# Altium schematic symbol library jlcpcb_2025_04_inductors_extended_0805.schlib: 882 symbols (part 1 of 5) (continued)
## CL201209T-R22K-N (continued)

## CL201209T-R39K-N
designator L?  Inductance: 390nH
Inductor, 390nH, ±10%, 650mΩ, 250mA, SMD 0805; Manufacturer: Chilisin Elec; Manufacturer Part Number: CL201209T-R39K-N; Self-Resonant Frequency: 135MHz; Q Factor: 25@25MHz; Package Size: 0805; JLCPCB Basic Part: No; JLCPCB Part Number: C280243; Supplier 1: LCSC; Category: Inductors; Supplier Part Number 1: C280243; Tolerance: ±10%; Rated Current: 250mA; DC Resistance: 650mΩ; RoHS: Yes; ComponentLink1Description: Datasheet; ComponentLink1URL: https://wmsc.lcsc.com/wmsc/upload/file/pdf/v2/lcsc/2304140030_Chilisin-Elec-CL201209T-R39K-N_C280243.pdf; ComponentLink2Description: JLCPCB Part URL; ComponentLink2URL: https://jlcpcb.com/partdetail/C280243; ComponentLink3Description: LCSC Part URL; ComponentLink3URL: https://lcsc.com/product-detail/Inductors-SMD_Chilisin-Elec-Chilisin-Elec-CL201209T-R39K-N_C280243.html
footprint IND-0805 (0805 (2012M) Inductor)
pins: 1, 2

## CL201209T-R47K-N
designator L?  Inductance: 470nH
Inductor, 470nH, ±10%, 650mΩ, 250mA, SMD 0805; Manufacturer: Chilisin Elec; Manufacturer Part Number: CL201209T-R47K-N; Self-Resonant Frequency: 125MHz; Q Factor: 25@25MHz; Package Size: 0805; JLCPCB Basic Part: No; JLCPCB Part Number: C142264; Supplier 1: LCSC; Category: Inductors; Supplier Part Number 1: C142264; Tolerance: ±10%; Rated Current: 250mA; DC Resistance: 650mΩ; RoHS: Yes; ComponentLink1Description: Datasheet; ComponentLink1URL: https://wmsc.lcsc.com/wmsc/upload/file/pdf/v2/lcsc/2304140030_Chilisin-Elec-CL201209T-R47K-N_C142264.pdf; ComponentLink2Description: JLCPCB Part URL; ComponentLink2URL: https://jlcpcb.com/partdetail/C142264; ComponentLink3Description: LCSC Part URL; ComponentLink3URL: https://lcsc.com/product-detail/Inductors-SMD_Chilisin-Elec-Chilisin-Elec-CL201209T-R47K-N_C142264.html
footprint IND-0805 (0805 (2012M) Inductor)
pins: 1, 2

## CL201209T-R56K-N
designator L?  Inductance: 560nH
Inductor, 560nH, ±10%, 750mΩ, 150mA, SMD 0805; Manufacturer: Chilisin Elec; Manufacturer Part Number: CL201209T-R56K-N; Self-Resonant Frequency: 115MHz; Q Factor: 25@25MHz; Package Size: 0805; JLCPCB Basic Part: No; JLCPCB Part Number: C280244; Supplier 1: LCSC; Category: Inductors; Supplier Part Number 1: C280244; Tolerance: ±10%; Rated Current: 150mA; DC Resistance: 750mΩ; RoHS: Yes; ComponentLink1Description: Datasheet; ComponentLink1URL: https://wmsc.lcsc.com/wmsc/upload/file/pdf/v2/lcsc/2304140030_Chilisin-Elec-CL201209T-R56K-N_C280244.pdf; ComponentLink2Description: JLCPCB Part URL; ComponentLink2URL: https://jlcpcb.com/partdetail/C280244; ComponentLink3Description: LCSC Part URL; ComponentLink3URL: https://lcsc.com/product-detail/Inductors-SMD_Chilisin-Elec-Chilisin-Elec-CL201209T-R56K-N_C280244.html
footprint IND-0805 (0805 (2012M) Inductor)
pins: 1, 2

## CL201212T-3R3K-N
designator L?  Inductance: 3.3uH
Inductor, 3.3uH, ±10%, 800mΩ, 30mA, SMD 0805; Manufacturer: Chilisin Elec; Manufacturer Part Number: CL201212T-3R3K-N; Self-Resonant Frequency: 41MHz; Q Factor: 45@10MHz; Package Size: 0805; JLCPCB Basic Part: No; JLCPCB Part Number: C373736; Supplier 1: LCSC; Category: Inductors; Supplier Part Number 1: C373736; Tolerance: ±10%; Rated Current: 30mA; DC Resistance: 800mΩ; RoHS: Yes; ComponentLink1Description: Datasheet; ComponentLink1URL: https://wmsc.lcsc.com/wmsc/upload/file/pdf/v2/lcsc/1912111437_Chilisin-Elec-CL201212T-3R3K-N_C373736.pdf; ComponentLink2Description: JLCPCB Part URL; ComponentLink2URL: https://jlcpcb.com/partdetail/C373736; ComponentLink3Description: LCSC Part URL; ComponentLink3URL: https://lcsc.com/product-detail/Inductors-SMD_Chilisin-Elec-Chilisin-Elec-CL201212T-3R3K-N_C373736.html
footprint IND-0805 (0805 (2012M) Inductor)
pins: 1, 2

## CL201212T-4R7K-F
designator L?  Inductance: 4.7uH
Inductor, 4.7uH, ±10%, SMD 0805; Manufacturer: Chilisin Elec; Manufacturer Part Number: CL201212T-4R7K-F; Package Size: 0805; JLCPCB Basic Part: No; JLCPCB Part Number: C285980; Supplier 1: LCSC; Category: Inductors; Supplier Part Number 1: C285980; Tolerance: ±10%; RoHS: Yes; ComponentLink1Description: Datasheet; ComponentLink1URL: https://wmsc.lcsc.com/wmsc/upload/file/pdf/v2/lcsc/2304140030_Chilisin-Elec-CL201212T-4R7K-F_C285980.pdf; ComponentLink2Description: JLCPCB Part URL; ComponentLink2URL: https://jlcpcb.com/partdetail/C285980; ComponentLink3Description: LCSC Part URL; ComponentLink3URL: https://lcsc.com/product-detail/Inductors-SMD_Chilisin-Elec-Chilisin-Elec-CL201212T-4R7K-F_C285980.html
footprint IND-0805 (0805 (2012M) Inductor)
pins: 1, 2

## CL201212T-6R8K-N
designator L?  Inductance: 6.8uH
Inductor, 6.8uH, ±10%, 1Ω, 15mA, SMD 0805; Manufacturer: Chilisin Elec; Manufacturer Part Number: CL201212T-6R8K-N; Self-Resonant Frequency: 29MHz; Q Factor: 45@4MHz; Package Size: 0805; JLCPCB Basic Part: No; JLCPCB Part Number: C365941; Supplier 1: LCSC; Category: Inductors; Supplier Part Number 1: C365941; Tolerance: ±10%; Rated Current: 15mA; DC Resistance: 1Ω; RoHS: Yes; ComponentLink1Description: Datasheet; ComponentLink1URL: https://wmsc.lcsc.com/wmsc/upload/file/pdf/v2/lcsc/2304140030_Chilisin-Elec-CL201212T-6R8K-N_C365941.pdf; ComponentLink2Description: JLCPCB Part URL; ComponentLink2URL: https://jlcpcb.com/partdetail/C365941; ComponentLink3Description: LCSC Part URL; ComponentLink3URL: https://lcsc.com/product-detail/Inductors-SMD_Chilisin-Elec-Chilisin-Elec-CL201212T-6R8K-N_C365941.html
footprint IND-0805 (0805 (2012M) Inductor)
pins: 1, 2

## CL201212T-8R2K-N
designator L?  Inductance: 8.2uH
Inductor, 8.2uH, ±10%, 1.1Ω, 15mA, SMD 0805; Manufacturer: Chilisin Elec; Manufacturer Part Number: CL201212T-8R2K-N; Self-Resonant Frequency: 26MHz; Q Factor: 45@4MHz; Package Size: 0805; JLCPCB Basic Part: No; JLCPCB Part Number: C365944; Supplier 1: LCSC; Category: Inductors; Supplier Part Number 1: C365944; Tolerance: ±10%; Rated Current: 15mA; DC Resistance: 1.1Ω; RoHS: Yes; ComponentLink1Description: Datasheet; ComponentLink1URL: https://wmsc.lcsc.com/wmsc/upload/file/pdf/v2/lcsc/2304140030_Chilisin-Elec-CL201212T-8R2K-N_C365944.pdf; ComponentLink2Description: JLCPCB Part URL; ComponentLink2URL: https://jlcpcb.com/partdetail/C365944; ComponentLink3Description: LCSC Part URL; ComponentLink3URL: https://lcsc.com/product-detail/Inductors-SMD_Chilisin-Elec-Chilisin-Elec-CL201212T-8R2K-N_C365944.html
footprint IND-0805 (0805 (2012M) Inductor)
pins: 1, 2

## CL201212T-100K-N
designator L?  Inductance: 10uH
Inductor, 10uH, ±10%, 1.1Ω, 15mA, SMD 0805; Manufacturer: Chilisin Elec; Manufacturer Part Number: CL201212T-100K-N; Self-Resonant Frequency: 24MHz; Q Factor: 45@2MHz; Package Size: 0805; JLCPCB Basic Part: No; JLCPCB Part Number: C142263; Supplier 1: LCSC; Category: Inductors; Supplier Part Number 1: C142263; Tolerance: ±10%; Rated Current: 15mA; DC Resistance: 1.1Ω; RoHS: Yes; ComponentLink1Description: Datasheet; ComponentLink1URL: https://wmsc.lcsc.com/wmsc/upload/file/pdf/v2/lcsc/2304140030_Chilisin-Elec-CL201212T-100K-N_C142263.pdf; ComponentLink2Description: JLCPCB Part URL; ComponentLink2URL: https://jlcpcb.com/partdetail/C142263; ComponentLink3Description: LCSC Part URL; ComponentLink3URL: https://lcsc.com/product-detail/Inductors-SMD_Chilisin-Elec-Chilisin-Elec-CL201212T-100K-N_C142263.html
footprint IND-0805 (0805 (2012M) Inductor)
pins: 1, 2

## CL201212T-100M-N
designator L?  Inductance: 10uH
Inductor, 10uH, ±20%, 1.1Ω, 15mA, SMD 0805; Manufacturer: Chilisin Elec; Manufacturer Part Number: CL201212T-100M-N; Self-Resonant Frequency: 24MHz; Q Factor: 45@2MHz; Package Size: 0805; JLCPCB Basic Part: No; JLCPCB Part Number: C285981; Supplier 1: LCSC; Category: Inductors; Supplier Part Number 1: C285981; Tolerance: ±20%; Rated Current: 15mA; DC Resistance: 1.1Ω; RoHS: Yes; ComponentLink1Description: Datasheet; ComponentLink1URL: https://wmsc.lcsc.com/wmsc/upload/file/pdf/v2/lcsc/2304140030_Chilisin-Elec-CL201212T-100M-N_C285981.pdf; ComponentLink2Description: JLCPCB Part URL; ComponentLink2URL: https://jlcpcb.com/partdetail/C285981; ComponentLink3Description: LCSC Part URL; ComponentLink3URL: https://lcsc.com/product-detail/Inductors-SMD_Chilisin-Elec-Chilisin-Elec-CL201212T-100M-N_C285981.html
footprint IND-0805 (0805 (2012M) Inductor)
pins: 1, 2

## CL201212T-220K-N
designator L?  Inductance: 22uH
Inductor, 22uH, ±10%, 1.1Ω, 5mA, SMD 0805; Manufacturer: Chilisin Elec; Manufacturer Part Number: CL201212T-220K-N; Self-Resonant Frequency: 16MHz; Q Factor: 30@1MHz; Package Size: 0805; JLCPCB Basic Part: No; JLCPCB Part Number: C365913; Supplier 1: LCSC; Category: Inductors; Supplier Part Number 1: C365913; Tolerance: ±10%; Rated Current: 5mA; DC Resistance: 1.1Ω; RoHS: Yes; ComponentLink1Description: Datasheet; ComponentLink1URL: https://wmsc.lcsc.com/wmsc/upload/file/pdf/v2/lcsc/1912111437_Chilisin-Elec-CL201212T-220K-N_C365913.pdf; ComponentLink2Description: JLCPCB Part URL; ComponentLink2URL: https://jlcpcb.com/partdetail/C365913; ComponentLink3Description: LCSC Part URL; ComponentLink3URL: https://lcsc.com/product-detail/Inductors-SMD_Chilisin-Elec-Chilisin-Elec-CL201212T-220K-N_C365913.html
footprint IND-0805 (0805 (2012M) Inductor)
pins: 1, 2

## CLH2012T-6N8J-S
designator L?  Inductance: 6.8nH
Inductor, 6.8nH, ±5%, 250mΩ, 300mA, SMD 0805; Manufacturer: Chilisin Elec; Manufacturer Part Number: CLH2012T-6N8J-S; Self-Resonant Frequency: 3.65GHz; Q Factor: 15@100MHz; Package Size: 0805; JLCPCB Basic Part: No; JLCPCB Part Number: C329644; Supplier 1: LCSC; Category: Inductors; Supplier Part Number 1: C329644; Tolerance: ±5%; Rated Current: 300mA; DC Resistance: 250mΩ; RoHS: Yes; ComponentLink1Description: Datasheet; ComponentLink1URL: https://wmsc.lcsc.com/wmsc/upload/file/pdf/v2/lcsc/1912111437_Chilisin-Elec-CLH2012T-6N8J-S_C329644.pdf; ComponentLink2Description: JLCPCB Part URL; ComponentLink2URL: https://jlcpcb.com/partdetail/C329644; ComponentLink3Description: LCSC Part URL; ComponentLink3URL: https://lcsc.com/product-detail/Inductors-SMD_Chilisin-Elec-Chilisin-Elec-CLH2012T-6N8J-S_C329644.html
footprint IND-0805 (0805 (2012M) Inductor)
pins: 1, 2

## CLH2012T-10NJ-S
designator L?  Inductance: 10nH
Inductor, 10nH, ±5%, 300mΩ, 300mA, SMD 0805; Manufacturer: Chilisin Elec; Manufacturer Part Number: CLH2012T-10NJ-S; Self-Resonant Frequency: 2.5GHz; Q Factor: 18@100MHz; Package Size: 0805; JLCPCB Basic Part: No; JLCPCB Part Number: C180932; Supplier 1: LCSC; Category: Inductors; Supplier Part Number 1: C180932; Tolerance: ±5%; Rated Current: 300mA; DC Resistance: 300mΩ; RoHS: Yes; ComponentLink1Description: Datasheet; ComponentLink1URL: https://wmsc.lcsc.com/wmsc/upload/file/pdf/v2/lcsc/1810261211_Chilisin-Elec-CLH2012T-10NJ-S_C180932.pdf; ComponentLink2Description: JLCPCB Part URL; ComponentLink2URL: https://jlcpcb.com/partdetail/C180932; ComponentLink3Description: LCSC Part URL; ComponentLink3URL: https://lcsc.com/product-detail/Inductors-SMD_Chilisin-Elec-Chilisin-Elec-CLH2012T-10NJ-S_C180932.html
footprint IND-0805 (0805 (2012M) Inductor)
pins: 1, 2

## CLH2012T-22NJ-S
designator L?  Inductance: 22nH
Inductor, 22nH, ±5%, 500mΩ, 300mA, SMD 0805; Manufacturer: Chilisin Elec; Manufacturer Part Number: CLH2012T-22NJ-S; Self-Resonant Frequency: 1.7GHz; Q Factor: 18@100MHz; Package Size: 0805; JLCPCB Basic Part: No; JLCPCB Part Number: C180930; Supplier 1: LCSC; Category: Inductors; Supplier Part Number 1: C180930; Tolerance: ±5%; Rated Current: 300mA; DC Resistance: 500mΩ; RoHS: Yes; ComponentLink1Description: Datasheet; ComponentLink1URL: https://wmsc.lcsc.com/wmsc/upload/file/pdf/v2/lcsc/1810261211_Chilisin-Elec-CLH2012T-22NJ-S_C180930.pdf; ComponentLink2Description: JLCPCB Part URL; ComponentLink2URL: https://jlcpcb.com/partdetail/C180930; ComponentLink3Description: LCSC Part URL; ComponentLink3URL: https://lcsc.com/product-detail/Inductors-SMD_Chilisin-Elec-Chilisin-Elec-CLH2012T-22NJ-S_C180930.html
footprint IND-0805 (0805 (2012M) Inductor)
pins: 1, 2

## CMCC2012C4N7SSP
designator L?  Inductance: 4.7nH
Inductor, 4.7nH, 0.2Ω, 500mA, SMD 0805; Manufacturer: Cybermax; Manufacturer Part Number: CMCC2012C4N7SSP; Self-Resonant Frequency: 4GHz; Q Factor: 12@100MHz; Package Size: 0805; JLCPCB Basic Part: No; JLCPCB Part Number: C919374; Supplier 1: LCSC; Category: Inductors; Supplier Part Number 1: C919374; Rated Current: 500mA; DC Resistance: 0.2Ω; RoHS: Yes; ComponentLink1Description: Datasheet; ComponentLink1URL: https://wmsc.lcsc.com/wmsc/upload/file/pdf/v2/lcsc/2404011708_Cybermax-CMCC2012C4N7SSP_C919374.pdf; ComponentLink2Description: JLCPCB Part URL; ComponentLink2URL: https://jlcpcb.com/partdetail/C919374; ComponentLink3Description: LCSC Part URL; ComponentLink3URL: https://lcsc.com/product-detail/Inductors-SMD_Cybermax-Cybermax-CMCC2012C4N7SSP_C919374.html
footprint IND-0805 (0805 (2012M) Inductor)
pins: 1, 2

## CMCC2012C15NJSP
designator L?  Inductance: 15nH
Inductor, 15nH, ±5%, 0.4Ω, 500mA, SMD 0805; Manufacturer: Cybermax; Manufacturer Part Number: CMCC2012C15NJSP; Self-Resonant Frequency: 1800MHz; Q Factor: 15@100MHz; Package Size: 0805; JLCPCB Basic Part: No; JLCPCB Part Number: C919377; Supplier 1: LCSC; Category: Inductors; Supplier Part Number 1: C919377; Tolerance: ±5%; Rated Current: 500mA; DC Resistance: 0.4Ω; RoHS: Yes; ComponentLink1Description: Datasheet; ComponentLink1URL: https://wmsc.lcsc.com/wmsc/upload/file/pdf/v2/lcsc/2404011708_Cybermax-CMCC2012C15NJSP_C919377.pdf; ComponentLink2Description: JLCPCB Part URL; ComponentLink2URL: https://jlcpcb.com/partdetail/C919377; ComponentLink3Description: LCSC Part URL; ComponentLink3URL: https://lcsc.com/product-detail/Inductors-SMD_Cybermax-Cybermax-CMCC2012C15NJSP_C919377.html
footprint IND-0805 (0805 (2012M) Inductor)
pins: 1, 2

## CMCC2012C47NJSP
designator L?  Inductance: 47nH
Inductor, 47nH, ±5%, 0.7Ω, 300mA, SMD 0805; Manufacturer: Cybermax; Manufacturer Part Number: CMCC2012C47NJSP; Self-Resonant Frequency: 1GHz; Q Factor: 18@100MHz; Package Size: 0805; JLCPCB Basic Part: No; JLCPCB Part Number: C919382; Supplier 1: LCSC; Category: Inductors; Supplier Part Number 1: C919382; Tolerance: ±5%; Rated Current: 300mA; DC Resistance: 0.7Ω; RoHS: Yes; ComponentLink1Description: Datasheet; ComponentLink1URL: https://wmsc.lcsc.com/wmsc/upload/file/pdf/v2/lcsc/2404011708_Cybermax-CMCC2012C47NJSP_C919382.pdf; ComponentLink2Description: JLCPCB Part URL; ComponentLink2URL: https://jlcpcb.com/partdetail/C919382; ComponentLink3Description: LCSC Part URL; ComponentLink3URL: https://lcsc.com/product-detail/Inductors-SMD_Cybermax-Cybermax-CMCC2012C47NJSP_C919382.html
footprint IND-0805 (0805 (2012M) Inductor)
pins: 1, 2

## CMCC2012CR12JSP
designator L?  Inductance: 0.12uH
Inductor, 0.12uH, ±5%, 0.95Ω, 300mA, SMD 0805; Manufacturer: Cybermax; Manufacturer Part Number: CMCC2012CR12JSP; Self-Resonant Frequency: 600MHz; Q Factor: 13@50MHz; Package Size: 0805; JLCPCB Basic Part: No; JLCPCB Part Number: C919386; Supplier 1: LCSC; Category: Inductors; Supplier Part Number 1: C919386; Tolerance: ±5%; Rated Current: 300mA; DC Resistance: 0.95Ω; RoHS: Yes; ComponentLink1Description: Datasheet; ComponentLink1URL: https://wmsc.lcsc.com/wmsc/upload/file/pdf/v2/lcsc/2404011708_Cybermax-CMCC2012CR12JSP_C919386.pdf; ComponentLink2Description: JLCPCB Part URL; ComponentLink2URL: https://jlcpcb.com/partdetail/C919386; ComponentLink3Description: LCSC Part URL; ComponentLink3URL: https://lcsc.com/product-detail/Inductors-SMD_Cybermax-Cybermax-CMCC2012CR12JSP_C919386.html
footprint IND-0805 (0805 (2012M) Inductor)
pins: 1, 2

## CMCC2012CR33JSP
designator L?  Inductance: 0.33uH
Inductor, 0.33uH, ±5%, 2Ω, 300mA, SMD 0805; Manufacturer: Cybermax; Manufacturer Part Number: CMCC2012CR33JSP; Self-Resonant Frequency: 300MHz; Q Factor: 12@50MHz; Package Size: 0805; JLCPCB Basic Part: No; JLCPCB Part Number: C919391; Supplier 1: LCSC; Category: Inductors; Supplier Part Number 1: C919391; Tolerance: ±5%; Rated Current: 300mA; DC Resistance: 2Ω; RoHS: Yes; ComponentLink1Description: Datasheet; ComponentLink1URL: https://wmsc.lcsc.com/wmsc/upload/file/pdf/v2/lcsc/2404011708_Cybermax-CMCC2012CR33JSP_C919391.pdf; ComponentLink2Description: JLCPCB Part URL; ComponentLink2URL: https://jlcpcb.com/partdetail/C919391; ComponentLink3Description: LCSC Part URL; ComponentLink3URL: https://lcsc.com/product-detail/Inductors-SMD_Cybermax-Cybermax-CMCC2012CR33JSP_C919391.html
footprint IND-0805 (0805 (2012M) Inductor)
pins: 1, 2

## CMI201209J150KT
designator L?  Inductance: 15uH
Inductor, 15uH, ±10%, 1.15Ω, 5mA, SMD 0805; Manufacturer: FH(Guangdong Fenghua Advanced Tech); Manufacturer Part Number: CMI201209J150KT; Self-Resonant Frequency: 19MHz; Q Factor: 25@1MHz; Package Size: 0805; JLCPCB Basic Part: No; JLCPCB Part Number: C75634; Supplier 1: LCSC; Category: Inductors; Supplier Part Number 1: C75634; Tolerance: ±10%; Rated Current: 5mA; DC Resistance: 1.15Ω; RoHS: Yes; ComponentLink1Description: Datasheet; ComponentLink1URL: https://wmsc.lcsc.com/wmsc/upload/file/pdf/v2/lcsc/2302231101_FH--Guangdong-Fenghua-Advanced-Tech-CMI201209J150KT_C75634.pdf; ComponentLink2Description: JLCPCB Part URL; ComponentLink2URL: https://jlcpcb.com/partdetail/C75634; ComponentLink3Description: LCSC Part URL; ComponentLink3URL: https://lcsc.com/product-detail/Inductors-SMD_FH-Guangdong-Fenghua-Advanced-Tech-FH-Guangdong-Fenghua-Advanced-Tech-CMI201209J150KT_C75634.html
footprint IND-0805 (0805 (2012M) Inductor)
pins: 1, 2

## CMI201209J180KT
designator L?  Inductance: 18uH
Inductor, 18uH, ±10%, 1.2Ω, 5mA, SMD 0805; Manufacturer: FH(Guangdong Fenghua Advanced Tech); Manufacturer Part Number: CMI201209J180KT; Self-Resonant Frequency: 18MHz; Q Factor: 25@1MHz; Package Size: 0805; JLCPCB Basic Part: No; JLCPCB Part Number: C394970; Supplier 1: LCSC; Category: Inductors; Supplier Part Number 1: C394970; Tolerance: ±10%; Rated Current: 5mA; DC Resistance: 1.2Ω; RoHS: Yes; ComponentLink1Description: Datasheet; ComponentLink1URL: https://wmsc.lcsc.com/wmsc/upload/file/pdf/v2/lcsc/2302231208_FH--Guangdong-Fenghua-Advanced-Tech-CMI201209J180KT_C394970.pdf; ComponentLink2Description: JLCPCB Part URL; ComponentLink2URL: https://jlcpcb.com/partdetail/C394970; ComponentLink3Description: LCSC Part URL; ComponentLink3URL: https://lcsc.com/product-detail/Inductors-SMD_FH-Guangdong-Fenghua-Advanced-Tech-FH-Guangdong-Fenghua-Advanced-Tech-CMI201209J180KT_C394970.html
footprint IND-0805 (0805 (2012M) Inductor)
pins: 1, 2

## CMI201209J220KT
designator L?  Inductance: 22uH
Inductor, 22uH, ±10%, 1.2Ω, 5mA, SMD 0805; Manufacturer: FH(Guangdong Fenghua Advanced Tech); Manufacturer Part Number: CMI201209J220KT; Self-Resonant Frequency: 16MHz; Q Factor: 25@1MHz; Package Size: 0805; JLCPCB Basic Part: No; JLCPCB Part Number: C105501; Supplier 1: LCSC; Category: Inductors; Supplier Part Number 1: C105501; Tolerance: ±10%; Rated Current: 5mA; DC Resistance: 1.2Ω; RoHS: Yes; ComponentLink1Description: Datasheet; ComponentLink1URL: https://wmsc.lcsc.com/wmsc/upload/file/pdf/v2/lcsc/2302231030_FH--Guangdong-Fenghua-Advanced-Tech-CMI201209J220KT_C105501.pdf; ComponentLink2Description: JLCPCB Part URL; ComponentLink2URL: https://jlcpcb.com/partdetail/C105501; ComponentLink3Description: LCSC Part URL; ComponentLink3URL: https://lcsc.com/product-detail/Inductors-SMD_FH-Guangdong-Fenghua-Advanced-Tech-FH-Guangdong-Fenghua-Advanced-Tech-CMI201209J220KT_C105501.html
footprint IND-0805 (0805 (2012M) Inductor)
pins: 1, 2

## CMI201209J270KT
designator L?  Inductance: 27uH
Inductor, 27uH, ±10%, 1.5Ω, 5mA, SMD 0805; Manufacturer: FH(Guangdong Fenghua Advanced Tech); Manufacturer Part Number: CMI201209J270KT; Self-Resonant Frequency: 16MHz; Q Factor: 25@1MHz; Package Size: 0805; JLCPCB Basic Part: No; JLCPCB Part Number: C394971; Supplier 1: LCSC; Category: Inductors; Supplier Part Number 1: C394971; Tolerance: ±10%; Rated Current: 5mA; DC Resistance: 1.5Ω; RoHS: Yes; ComponentLink1Description: Datasheet; ComponentLink1URL: https://wmsc.lcsc.com/wmsc/upload/file/pdf/v2/lcsc/2302231208_FH--Guangdong-Fenghua-Advanced-Tech-CMI201209J270KT_C394971.pdf; ComponentLink2Description: JLCPCB Part URL; ComponentLink2URL: https://jlcpcb.com/partdetail/C394971; ComponentLink3Description: LCSC Part URL; ComponentLink3URL: https://lcsc.com/product-detail/Inductors-SMD_FH-Guangdong-Fenghua-Advanced-Tech-FH-Guangdong-Fenghua-Advanced-Tech-CMI201209J270KT_C394971.html
footprint IND-0805 (0805 (2012M) Inductor)
pins: 1, 2

## CMI201209J330KT
designator L?  Inductance: 33uH
Inductor, 33uH, ±10%, SMD 0805; Manufacturer: FH(Guangdong Fenghua Advanced Tech); Manufacturer Part Number: CMI201209J330KT; Package Size: 0805; JLCPCB Basic Part: No; JLCPCB Part Number: C139218; Supplier 1: LCSC; Category: Inductors; Supplier Part Number 1: C139218; Tolerance: ±10%; RoHS: Yes; ComponentLink1Description: Datasheet; ComponentLink1URL: https://wmsc.lcsc.com/wmsc/upload/file/pdf/v2/lcsc/2307041629_FH--Guangdong-Fenghua-Advanced-Tech-CMI201209J330KT_C139218.pdf; ComponentLink2Description: JLCPCB Part URL; ComponentLink2URL: https://jlcpcb.com/partdetail/C139218; ComponentLink3Description: LCSC Part URL; ComponentLink3URL: https://lcsc.com/product-detail/Inductors-SMD_FH-Guangdong-Fenghua-Advanced-Tech-FH-Guangdong-Fenghua-Advanced-Tech-CMI201209J330KT_C139218.html
footprint IND-0805 (0805 (2012M) Inductor)
pins: 1, 2

## CMI201209U1R0KT
designator L?  Inductance: 1uH
Inductor, 1uH, ±10%, 400mΩ, 50mA, SMD 0805; Manufacturer: FH(Guangdong Fenghua Advanced Tech); Manufacturer Part Number: CMI201209U1R0KT; Self-Resonant Frequency: 75MHz; Q Factor: 35@10MHz; Package Size: 0805; JLCPCB Basic Part: No; JLCPCB Part Number: C99367; Supplier 1: LCSC; Category: Inductors; Supplier Part Number 1: C99367; Tolerance: ±10%; Rated Current: 50mA; DC Resistance: 400mΩ; RoHS: Yes; ComponentLink1Description: Datasheet; ComponentLink1URL: https://wmsc.lcsc.com/wmsc/upload/file/pdf/v2/lcsc/2302231230_FH--Guangdong-Fenghua-Advanced-Tech-CMI201209U1R0KT_C99367.pdf; ComponentLink2Description: JLCPCB Part URL; ComponentLink2URL: https://jlcpcb.com/partdetail/C99367; ComponentLink3Description: LCSC Part URL; ComponentLink3URL: https://lcsc.com/product-detail/Inductors-SMD_FH-Guangdong-Fenghua-Advanced-Tech-FH-Guangdong-Fenghua-Advanced-Tech-CMI201209U1R0KT_C99367.html
footprint IND-0805 (0805 (2012M) Inductor)
pins: 1, 2

## CMI201209U1R2KT
designator L?  Inductance: 1.2uH
Inductor, 1.2uH, ±10%, 400mΩ, 50mA, SMD 0805; Manufacturer: FH(Guangdong Fenghua Advanced Tech); Manufacturer Part Number: CMI201209U1R2KT; Self-Resonant Frequency: 65MHz; Q Factor: 35@10MHz; Package Size: 0805; JLCPCB Basic Part: No; JLCPCB Part Number: C139219; Supplier 1: LCSC; Category: Inductors; Supplier Part Number 1: C139219; Tolerance: ±10%; Rated Current: 50mA; DC Resistance: 400mΩ; RoHS: Yes; ComponentLink1Description: Datasheet; ComponentLink1URL: https://wmsc.lcsc.com/wmsc/upload/file/pdf/v2/lcsc/2302231230_FH--Guangdong-Fenghua-Advanced-Tech-CMI201209U1R2KT_C139219.pdf; ComponentLink2Description: JLCPCB Part URL; ComponentLink2URL: https://jlcpcb.com/partdetail/C139219; ComponentLink3Description: LCSC Part URL; ComponentLink3URL: https://lcsc.com/product-detail/Inductors-SMD_FH-Guangdong-Fenghua-Advanced-Tech-FH-Guangdong-Fenghua-Advanced-Tech-CMI201209U1R2KT_C139219.html
footprint IND-0805 (0805 (2012M) Inductor)
pins: 1, 2

## CMI201209U1R5KT
designator L?  Inductance: 1.5uH
Inductor, 1.5uH, ±10%, 400mΩ, 50mA, SMD 0805; Manufacturer: FH(Guangdong Fenghua Advanced Tech); Manufacturer Part Number: CMI201209U1R5KT; Self-Resonant Frequency: 60MHz; Q Factor: 35@10MHz; Package Size: 0805; JLCPCB Basic Part: No; JLCPCB Part Number: C139220; Supplier 1: LCSC; Category: Inductors; Supplier Part Number 1: C139220; Tolerance: ±10%; Rated Current: 50mA; DC Resistance: 400mΩ; RoHS: Yes; ComponentLink1Description: Datasheet; ComponentLink1URL: https://wmsc.lcsc.com/wmsc/upload/file/pdf/v2/lcsc/2302231230_FH--Guangdong-Fenghua-Advanced-Tech-CMI201209U1R5KT_C139220.pdf; ComponentLink2Description: JLCPCB Part URL; ComponentLink2URL: https://jlcpcb.com/partdetail/C139220; ComponentLink3Description: LCSC Part URL; ComponentLink3URL: https://lcsc.com/product-detail/Inductors-SMD_FH-Guangdong-Fenghua-Advanced-Tech-FH-Guangdong-Fenghua-Advanced-Tech-CMI201209U1R5KT_C139220.html
footprint IND-0805 (0805 (2012M) Inductor)
pins: 1, 2

## CMI201209U1R8KT
designator L?  Inductance: 1.8uH
Inductor, 1.8uH, ±10%, 400mΩ, 50mA, SMD 0805; Manufacturer: FH(Guangdong Fenghua Advanced Tech); Manufacturer Part Number: CMI201209U1R8KT; Self-Resonant Frequency: 55MHz; Q Factor: 35@10MHz; Package Size: 0805; JLCPCB Basic Part: No; JLCPCB Part Number: C139221; Supplier 1: LCSC; Category: Inductors; Supplier Part Number 1: C139221; Tolerance: ±10%; Rated Current: 50mA; DC Resistance: 400mΩ; RoHS: Yes; ComponentLink1Description: Datasheet; ComponentLink1URL: https://wmsc.lcsc.com/wmsc/upload/file/pdf/v2/lcsc/2302231230_FH--Guangdong-Fenghua-Advanced-Tech-CMI201209U1R8KT_C139221.pdf; ComponentLink2Description: JLCPCB Part URL; ComponentLink2URL: https://jlcpcb.com/partdetail/C139221; ComponentLink3Description: LCSC Part URL; ComponentLink3URL: https://lcsc.com/product-detail/Inductors-SMD_FH-Guangdong-Fenghua-Advanced-Tech-FH-Guangdong-Fenghua-Advanced-Tech-CMI201209U1R8KT_C139221.html
footprint IND-0805 (0805 (2012M) Inductor)
pins: 1, 2

## CMI201209U2R2KT
designator L?  Inductance: 2.2uH
Inductor, 2.2uH, ±10%, 600mΩ, 50mA, SMD 0805; Manufacturer: FH(Guangdong Fenghua Advanced Tech); Manufacturer Part Number: CMI201209U2R2KT; Self-Resonant Frequency: 50MHz; Q Factor: 35@10MHz; Package Size: 0805; JLCPCB Basic Part: No; JLCPCB Part Number: C1043; Supplier 1: LCSC; Category: Inductors; Supplier Part Number 1: C1043; Tolerance: ±10%; Rated Current: 50mA; DC Resistance: 600mΩ; RoHS: Yes; ComponentLink1Description: Datasheet; ComponentLink1URL: https://wmsc.lcsc.com/wmsc/upload/file/pdf/v2/lcsc/2302231101_FH--Guangdong-Fenghua-Advanced-Tech-CMI201209U2R2KT_C1043.pdf; ComponentLink2Description: JLCPCB Part URL; ComponentLink2URL: https://jlcpcb.com/partdetail/C1043; ComponentLink3Description: LCSC Part URL; ComponentLink3URL: https://lcsc.com/product-detail/Inductors-SMD_FH-Guangdong-Fenghua-Advanced-Tech-FH-Guangdong-Fenghua-Advanced-Tech-CMI201209U2R2KT_C1043.html
footprint IND-0805 (0805 (2012M) Inductor)
pins: 1, 2

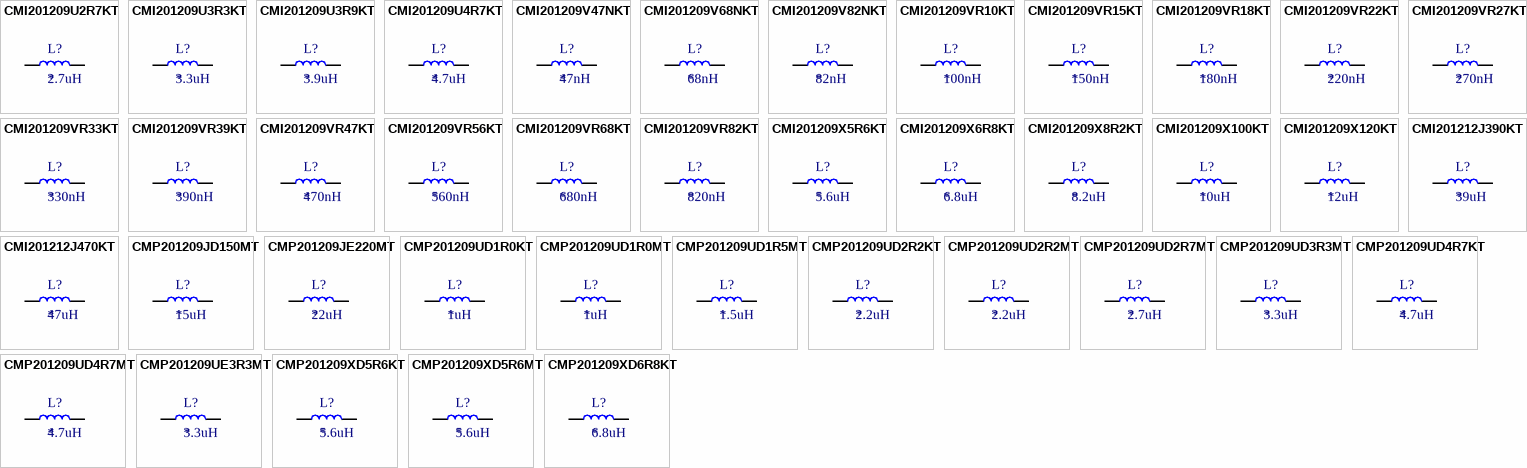
[diagram p3: symbols CMI201209U2R7KT to CMP201209XD6R8KT]

## CMI201209U2R7KT
designator L?  Inductance: 2.7uH
Inductor, 2.7uH, ±10%, 600mΩ, 50mA, SMD 0805; Manufacturer: FH(Guangdong Fenghua Advanced Tech); Manufacturer Part Number: CMI201209U2R7KT; Self-Resonant Frequency: 45MHz; Q Factor: 35@10MHz; Package Size: 0805; JLCPCB Basic Part: No; JLCPCB Part Number: C139222; Supplier 1: LCSC; Category: Inductors; Supplier Part Number 1: C139222; Tolerance: ±10%; Rated Current: 50mA; DC Resistance: 600mΩ; RoHS: Yes; ComponentLink1Description: Datasheet; ComponentLink1URL: https://wmsc.lcsc.com/wmsc/upload/file/pdf/v2/lcsc/2302231230_FH--Guangdong-Fenghua-Advanced-Tech-CMI201209U2R7KT_C139222.pdf; ComponentLink2Description: JLCPCB Part URL; ComponentLink2URL: https://jlcpcb.com/partdetail/C139222; ComponentLink3Description: LCSC Part URL; ComponentLink3URL: https://lcsc.com/product-detail/Inductors-SMD_FH-Guangdong-Fenghua-Advanced-Tech-FH-Guangdong-Fenghua-Advanced-Tech-CMI201209U2R7KT_C139222.html
footprint IND-0805 (0805 (2012M) Inductor)
pins: 1, 2

## CMI201209U3R3KT
designator L?  Inductance: 3.3uH
Inductor, 3.3uH, ±10%, 700mΩ, 50mA, SMD 0805; Manufacturer: FH(Guangdong Fenghua Advanced Tech); Manufacturer Part Number: CMI201209U3R3KT; Self-Resonant Frequency: 41MHz; Q Factor: 35@10MHz; Package Size: 0805; JLCPCB Basic Part: No; JLCPCB Part Number: C93799; Supplier 1: LCSC; Category: Inductors; Supplier Part Number 1: C93799; Tolerance: ±10%; Rated Current: 50mA; DC Resistance: 700mΩ; RoHS: Yes; ComponentLink1Description: Datasheet; ComponentLink1URL: https://wmsc.lcsc.com/wmsc/upload/file/pdf/v2/lcsc/2302231230_FH--Guangdong-Fenghua-Advanced-Tech-CMI201209U3R3KT_C93799.pdf; ComponentLink2Description: JLCPCB Part URL; ComponentLink2URL: https://jlcpcb.com/partdetail/C93799; ComponentLink3Description: LCSC Part URL; ComponentLink3URL: https://lcsc.com/product-detail/Inductors-SMD_FH-Guangdong-Fenghua-Advanced-Tech-FH-Guangdong-Fenghua-Advanced-Tech-CMI201209U3R3KT_C93799.html
footprint IND-0805 (0805 (2012M) Inductor)
pins: 1, 2

## CMI201209U3R9KT
designator L?  Inductance: 3.9uH
Inductor, 3.9uH, ±10%, 800mΩ, 50mA, SMD 0805; Manufacturer: FH(Guangdong Fenghua Advanced Tech); Manufacturer Part Number: CMI201209U3R9KT; Self-Resonant Frequency: 38MHz; Q Factor: 35@10MHz; Package Size: 0805; JLCPCB Basic Part: No; JLCPCB Part Number: C69486; Supplier 1: LCSC; Category: Inductors; Supplier Part Number 1: C69486; Tolerance: ±10%; Rated Current: 50mA; DC Resistance: 800mΩ; RoHS: Yes; ComponentLink1Description: Datasheet; ComponentLink1URL: https://wmsc.lcsc.com/wmsc/upload/file/pdf/v2/lcsc/2302231300_FH--Guangdong-Fenghua-Advanced-Tech-CMI201209U3R9KT_C69486.pdf; ComponentLink2Description: JLCPCB Part URL; ComponentLink2URL: https://jlcpcb.com/partdetail/C69486; ComponentLink3Description: LCSC Part URL; ComponentLink3URL: https://lcsc.com/product-detail/Inductors-SMD_FH-Guangdong-Fenghua-Advanced-Tech-FH-Guangdong-Fenghua-Advanced-Tech-CMI201209U3R9KT_C69486.html
footprint IND-0805 (0805 (2012M) Inductor)
pins: 1, 2

## CMI201209U4R7KT
designator L?  Inductance: 4.7uH
Inductor, 4.7uH, ±10%, 900mΩ, 25mA, SMD 0805; Manufacturer: FH(Guangdong Fenghua Advanced Tech); Manufacturer Part Number: CMI201209U4R7KT; Self-Resonant Frequency: 35MHz; Q Factor: 35@10MHz; Package Size: 0805; JLCPCB Basic Part: No; JLCPCB Part Number: C99365; Supplier 1: LCSC; Category: Inductors; Supplier Part Number 1: C99365; Tolerance: ±10%; Rated Current: 25mA; DC Resistance: 900mΩ; RoHS: Yes; ComponentLink1Description: Datasheet; ComponentLink1URL: https://wmsc.lcsc.com/wmsc/upload/file/pdf/v2/lcsc/2302231230_FH--Guangdong-Fenghua-Advanced-Tech-CMI201209U4R7KT_C99365.pdf; ComponentLink2Description: JLCPCB Part URL; ComponentLink2URL: https://jlcpcb.com/partdetail/C99365; ComponentLink3Description: LCSC Part URL; ComponentLink3URL: https://lcsc.com/product-detail/Inductors-SMD_FH-Guangdong-Fenghua-Advanced-Tech-FH-Guangdong-Fenghua-Advanced-Tech-CMI201209U4R7KT_C99365.html
footprint IND-0805 (0805 (2012M) Inductor)
pins: 1, 2

## CMI201209V47NKT
designator L?  Inductance: 47nH
Inductor, 47nH, ±10%, SMD 0805; Manufacturer: FH (Guangdong Fenghua Advanced Tech); Manufacturer Part Number: CMI201209V47NKT; Package Size: 0805; JLCPCB Basic Part: No; JLCPCB Part Number: C3032659; Supplier 1: LCSC; Category: Inductors; Supplier Part Number 1: C3032659; Tolerance: ±10%; RoHS: Yes; ComponentLink1Description: Datasheet; ComponentLink1URL: https://wmsc.lcsc.com/wmsc/upload/file/pdf/v2/lcsc/2302231130_FH--Guangdong-Fenghua-Advanced-Tech-CMI201209V47NKT_C3032659.pdf; ComponentLink2Description: JLCPCB Part URL; ComponentLink2URL: https://jlcpcb.com/partdetail/C3032659; ComponentLink3Description: LCSC Part URL; ComponentLink3URL: https://lcsc.com/product-detail/Inductors-SMD_FH-Guangdong-Fenghua-Advanced-Tech-FH-Guangdong-Fenghua-Advanced-Tech-CMI201209V47NKT_C3032659.html
footprint IND-0805 (0805 (2012M) Inductor)
pins: 1, 2

## CMI201209V68NKT
designator L?  Inductance: 68nH
Inductor, 68nH, ±10%, SMD 0805; Manufacturer: FH (Guangdong Fenghua Advanced Tech); Manufacturer Part Number: CMI201209V68NKT; Package Size: 0805; JLCPCB Basic Part: No; JLCPCB Part Number: C3032677; Supplier 1: LCSC; Category: Inductors; Supplier Part Number 1: C3032677; Tolerance: ±10%; RoHS: Yes; ComponentLink1Description: Datasheet; ComponentLink1URL: https://wmsc.lcsc.com/wmsc/upload/file/pdf/v2/lcsc/2302231130_FH--Guangdong-Fenghua-Advanced-Tech-CMI201209V68NKT_C3032677.pdf; ComponentLink2Description: JLCPCB Part URL; ComponentLink2URL: https://jlcpcb.com/partdetail/C3032677; ComponentLink3Description: LCSC Part URL; ComponentLink3URL: https://lcsc.com/product-detail/Inductors-SMD_FH-Guangdong-Fenghua-Advanced-Tech-FH-Guangdong-Fenghua-Advanced-Tech-CMI201209V68NKT_C3032677.html
footprint IND-0805 (0805 (2012M) Inductor)
pins: 1, 2

## CMI201209V82NKT
designator L?  Inductance: 82nH
Inductor, 82nH, ±10%, SMD 0805; Manufacturer: FH (Guangdong Fenghua Advanced Tech); Manufacturer Part Number: CMI201209V82NKT; Package Size: 0805; JLCPCB Basic Part: No; JLCPCB Part Number: C3032658; Supplier 1: LCSC; Category: Inductors; Supplier Part Number 1: C3032658; Tolerance: ±10%; RoHS: Yes; ComponentLink1Description: Datasheet; ComponentLink1URL: https://wmsc.lcsc.com/wmsc/upload/file/pdf/v2/lcsc/2302231130_FH--Guangdong-Fenghua-Advanced-Tech-CMI201209V82NKT_C3032658.pdf; ComponentLink2Description: JLCPCB Part URL; ComponentLink2URL: https://jlcpcb.com/partdetail/C3032658; ComponentLink3Description: LCSC Part URL; ComponentLink3URL: https://lcsc.com/product-detail/Inductors-SMD_FH-Guangdong-Fenghua-Advanced-Tech-FH-Guangdong-Fenghua-Advanced-Tech-CMI201209V82NKT_C3032658.html
footprint IND-0805 (0805 (2012M) Inductor)
pins: 1, 2

## CMI201209VR10KT
designator L?  Inductance: 100nH
Inductor, 100nH, ±10%, 200mΩ, 250mA, SMD 0805; Manufacturer: FH(Guangdong Fenghua Advanced Tech); Manufacturer Part Number: CMI201209VR10KT; Self-Resonant Frequency: 235MHz; Q Factor: 20@25MHz; Package Size: 0805; JLCPCB Basic Part: No; JLCPCB Part Number: C394972; Supplier 1: LCSC; Category: Inductors; Supplier Part Number 1: C394972; Tolerance: ±10%; Rated Current: 250mA; DC Resistance: 200mΩ; RoHS: Yes; ComponentLink1Description: Datasheet; ComponentLink1URL: https://wmsc.lcsc.com/wmsc/upload/file/pdf/v2/lcsc/2302231208_FH--Guangdong-Fenghua-Advanced-Tech-CMI201209VR10KT_C394972.pdf; ComponentLink2Description: JLCPCB Part URL; ComponentLink2URL: https://jlcpcb.com/partdetail/C394972; ComponentLink3Description: LCSC Part URL; ComponentLink3URL: https://lcsc.com/product-detail/Inductors-SMD_FH-Guangdong-Fenghua-Advanced-Tech-FH-Guangdong-Fenghua-Advanced-Tech-CMI201209VR10KT_C394972.html
footprint IND-0805 (0805 (2012M) Inductor)
pins: 1, 2

## CMI201209VR15KT
designator L?  Inductance: 150nH
Inductor, 150nH, ±10%, 250mΩ, 250mA, SMD 0805; Manufacturer: FH(Guangdong Fenghua Advanced Tech); Manufacturer Part Number: CMI201209VR15KT; Self-Resonant Frequency: 200MHz; Q Factor: 20@25MHz; Package Size: 0805; JLCPCB Basic Part: No; JLCPCB Part Number: C139223; Supplier 1: LCSC; Category: Inductors; Supplier Part Number 1: C139223; Tolerance: ±10%; Rated Current: 250mA; DC Resistance: 250mΩ; RoHS: Yes; ComponentLink1Description: Datasheet; ComponentLink1URL: https://wmsc.lcsc.com/wmsc/upload/file/pdf/v2/lcsc/2302231230_FH--Guangdong-Fenghua-Advanced-Tech-CMI201209VR15KT_C139223.pdf; ComponentLink2Description: JLCPCB Part URL; ComponentLink2URL: https://jlcpcb.com/partdetail/C139223; ComponentLink3Description: LCSC Part URL; ComponentLink3URL: https://lcsc.com/product-detail/Inductors-SMD_FH-Guangdong-Fenghua-Advanced-Tech-FH-Guangdong-Fenghua-Advanced-Tech-CMI201209VR15KT_C139223.html
footprint IND-0805 (0805 (2012M) Inductor)
pins: 1, 2

## CMI201209VR18KT
designator L?  Inductance: 180nH
Inductor, 180nH, ±10%, 300mΩ, 250mA, SMD 0805; Manufacturer: FH(Guangdong Fenghua Advanced Tech); Manufacturer Part Number: CMI201209VR18KT; Self-Resonant Frequency: 185MHz; Q Factor: 20@25MHz; Package Size: 0805; JLCPCB Basic Part: No; JLCPCB Part Number: C139224; Supplier 1: LCSC; Category: Inductors; Supplier Part Number 1: C139224; Tolerance: ±10%; Rated Current: 250mA; DC Resistance: 300mΩ; RoHS: Yes; ComponentLink1Description: Datasheet; ComponentLink1URL: https://wmsc.lcsc.com/wmsc/upload/file/pdf/v2/lcsc/2302231230_FH--Guangdong-Fenghua-Advanced-Tech-CMI201209VR18KT_C139224.pdf; ComponentLink2Description: JLCPCB Part URL; ComponentLink2URL: https://jlcpcb.com/partdetail/C139224; ComponentLink3Description: LCSC Part URL; ComponentLink3URL: https://lcsc.com/product-detail/Inductors-SMD_FH-Guangdong-Fenghua-Advanced-Tech-FH-Guangdong-Fenghua-Advanced-Tech-CMI201209VR18KT_C139224.html
footprint IND-0805 (0805 (2012M) Inductor)
pins: 1, 2

## CMI201209VR22KT
designator L?  Inductance: 220nH
Inductor, 220nH, ±10%, 300mΩ, 250mA, SMD 0805; Manufacturer: FH(Guangdong Fenghua Advanced Tech); Manufacturer Part Number: CMI201209VR22KT; Self-Resonant Frequency: 170MHz; Q Factor: 20@25MHz; Package Size: 0805; JLCPCB Basic Part: No; JLCPCB Part Number: C139225; Supplier 1: LCSC; Category: Inductors; Supplier Part Number 1: C139225; Tolerance: ±10%; Rated Current: 250mA; DC Resistance: 300mΩ; RoHS: Yes; ComponentLink1Description: Datasheet; ComponentLink1URL: https://wmsc.lcsc.com/wmsc/upload/file/pdf/v2/lcsc/2302231230_FH--Guangdong-Fenghua-Advanced-Tech-CMI201209VR22KT_C139225.pdf; ComponentLink2Description: JLCPCB Part URL; ComponentLink2URL: https://jlcpcb.com/partdetail/C139225; ComponentLink3Description: LCSC Part URL; ComponentLink3URL: https://lcsc.com/product-detail/Inductors-SMD_FH-Guangdong-Fenghua-Advanced-Tech-FH-Guangdong-Fenghua-Advanced-Tech-CMI201209VR22KT_C139225.html
footprint IND-0805 (0805 (2012M) Inductor)
pins: 1, 2

## CMI201209VR27KT
designator L?  Inductance: 270nH
Inductor, 270nH, ±10%, 400mΩ, 250mA, SMD 0805; Manufacturer: FH(Guangdong Fenghua Advanced Tech); Manufacturer Part Number: CMI201209VR27KT; Self-Resonant Frequency: 150MHz; Q Factor: 20@25MHz; Package Size: 0805; JLCPCB Basic Part: No; JLCPCB Part Number: C139226; Supplier 1: LCSC; Category: Inductors; Supplier Part Number 1: C139226; Tolerance: ±10%; Rated Current: 250mA; DC Resistance: 400mΩ; RoHS: Yes; ComponentLink1Description: Datasheet; ComponentLink1URL: https://wmsc.lcsc.com/wmsc/upload/file/pdf/v2/lcsc/2302231230_FH--Guangdong-Fenghua-Advanced-Tech-CMI201209VR27KT_C139226.pdf; ComponentLink2Description: JLCPCB Part URL; ComponentLink2URL: https://jlcpcb.com/partdetail/C139226; ComponentLink3Description: LCSC Part URL; ComponentLink3URL: https://lcsc.com/product-detail/Inductors-SMD_FH-Guangdong-Fenghua-Advanced-Tech-FH-Guangdong-Fenghua-Advanced-Tech-CMI201209VR27KT_C139226.html
footprint IND-0805 (0805 (2012M) Inductor)
pins: 1, 2

## CMI201209VR33KT
designator L?  Inductance: 330nH
Inductor, 330nH, ±10%, 400mΩ, 250mA, SMD 0805; Manufacturer: FH(Guangdong Fenghua Advanced Tech); Manufacturer Part Number: CMI201209VR33KT; Self-Resonant Frequency: 145MHz; Q Factor: 20@25MHz; Package Size: 0805; JLCPCB Basic Part: No; JLCPCB Part Number: C29069; Supplier 1: LCSC; Category: Inductors; Supplier Part Number 1: C29069; Tolerance: ±10%; Rated Current: 250mA; DC Resistance: 400mΩ; RoHS: Yes; ComponentLink1Description: Datasheet; ComponentLink1URL: https://wmsc.lcsc.com/wmsc/upload/file/pdf/v2/lcsc/2302231300_FH--Guangdong-Fenghua-Advanced-Tech-CMI201209VR33KT_C29069.pdf; ComponentLink2Description: JLCPCB Part URL; ComponentLink2URL: https://jlcpcb.com/partdetail/C29069; ComponentLink3Description: LCSC Part URL; ComponentLink3URL: https://lcsc.com/product-detail/Inductors-SMD_FH-Guangdong-Fenghua-Advanced-Tech-FH-Guangdong-Fenghua-Advanced-Tech-CMI201209VR33KT_C29069.html
footprint IND-0805 (0805 (2012M) Inductor)
pins: 1, 2

## CMI201209VR39KT
designator L?  Inductance: 390nH
Inductor, 390nH, ±10%, 500mΩ, 200mA, SMD 0805; Manufacturer: FH(Guangdong Fenghua Advanced Tech); Manufacturer Part Number: CMI201209VR39KT; Self-Resonant Frequency: 135MHz; Q Factor: 25@25MHz; Package Size: 0805; JLCPCB Basic Part: No; JLCPCB Part Number: C139227; Supplier 1: LCSC; Category: Inductors; Supplier Part Number 1: C139227; Tolerance: ±10%; Rated Current: 200mA; DC Resistance: 500mΩ; RoHS: Yes; ComponentLink1Description: Datasheet; ComponentLink1URL: https://wmsc.lcsc.com/wmsc/upload/file/pdf/v2/lcsc/2302231230_FH--Guangdong-Fenghua-Advanced-Tech-CMI201209VR39KT_C139227.pdf; ComponentLink2Description: JLCPCB Part URL; ComponentLink2URL: https://jlcpcb.com/partdetail/C139227; ComponentLink3Description: LCSC Part URL; ComponentLink3URL: https://lcsc.com/product-detail/Inductors-SMD_FH-Guangdong-Fenghua-Advanced-Tech-FH-Guangdong-Fenghua-Advanced-Tech-CMI201209VR39KT_C139227.html
footprint IND-0805 (0805 (2012M) Inductor)
pins: 1, 2

## CMI201209VR47KT
designator L?  Inductance: 470nH
Inductor, 470nH, ±10%, 500mΩ, 200mA, SMD 0805; Manufacturer: FH(Guangdong Fenghua Advanced Tech); Manufacturer Part Number: CMI201209VR47KT; Self-Resonant Frequency: 125MHz; Q Factor: 25@25MHz; Package Size: 0805; JLCPCB Basic Part: No; JLCPCB Part Number: C139228; Supplier 1: LCSC; Category: Inductors; Supplier Part Number 1: C139228; Tolerance: ±10%; Rated Current: 200mA; DC Resistance: 500mΩ; RoHS: Yes; ComponentLink1Description: Datasheet; ComponentLink1URL: https://wmsc.lcsc.com/wmsc/upload/file/pdf/v2/lcsc/2302231230_FH--Guangdong-Fenghua-Advanced-Tech-CMI201209VR47KT_C139228.pdf; ComponentLink2Description: JLCPCB Part URL; ComponentLink2URL: https://jlcpcb.com/partdetail/C139228; ComponentLink3Description: LCSC Part URL; ComponentLink3URL: https://lcsc.com/product-detail/Inductors-SMD_FH-Guangdong-Fenghua-Advanced-Tech-FH-Guangdong-Fenghua-Advanced-Tech-CMI201209VR47KT_C139228.html
footprint IND-0805 (0805 (2012M) Inductor)
pins: 1, 2

## CMI201209VR56KT
designator L?  Inductance: 560nH
Inductor, 560nH, ±10%, 600mΩ, 150mA, SMD 0805; Manufacturer: FH(Guangdong Fenghua Advanced Tech); Manufacturer Part Number: CMI201209VR56KT; Self-Resonant Frequency: 115MHz; Q Factor: 25@25MHz; Package Size: 0805; JLCPCB Basic Part: No; JLCPCB Part Number: C139229; Supplier 1: LCSC; Category: Inductors; Supplier Part Number 1: C139229; Tolerance: ±10%; Rated Current: 150mA; DC Resistance: 600mΩ; RoHS: Yes; ComponentLink1Description: Datasheet; ComponentLink1URL: https://wmsc.lcsc.com/wmsc/upload/file/pdf/v2/lcsc/2302231230_FH--Guangdong-Fenghua-Advanced-Tech-CMI201209VR56KT_C139229.pdf; ComponentLink2Description: JLCPCB Part URL; ComponentLink2URL: https://jlcpcb.com/partdetail/C139229; ComponentLink3Description: LCSC Part URL; ComponentLink3URL: https://lcsc.com/product-detail/Inductors-SMD_FH-Guangdong-Fenghua-Advanced-Tech-FH-Guangdong-Fenghua-Advanced-Tech-CMI201209VR56KT_C139229.html
footprint IND-0805 (0805 (2012M) Inductor)
pins: 1, 2

## CMI201209VR68KT
designator L?  Inductance: 680nH
Inductor, 680nH, ±10%, 650mΩ, 150mA, SMD 0805; Manufacturer: FH(Guangdong Fenghua Advanced Tech); Manufacturer Part Number: CMI201209VR68KT; Self-Resonant Frequency: 105MHz; Q Factor: 25@25MHz; Package Size: 0805; JLCPCB Basic Part: No; JLCPCB Part Number: C139230; Supplier 1: LCSC; Category: Inductors; Supplier Part Number 1: C139230; Tolerance: ±10%; Rated Current: 150mA; DC Resistance: 650mΩ; RoHS: Yes; ComponentLink1Description: Datasheet; ComponentLink1URL: https://wmsc.lcsc.com/wmsc/upload/file/pdf/v2/lcsc/2302231230_FH--Guangdong-Fenghua-Advanced-Tech-CMI201209VR68KT_C139230.pdf; ComponentLink2Description: JLCPCB Part URL; ComponentLink2URL: https://jlcpcb.com/partdetail/C139230; ComponentLink3Description: LCSC Part URL; ComponentLink3URL: https://lcsc.com/product-detail/Inductors-SMD_FH-Guangdong-Fenghua-Advanced-Tech-FH-Guangdong-Fenghua-Advanced-Tech-CMI201209VR68KT_C139230.html
footprint IND-0805 (0805 (2012M) Inductor)
pins: 1, 2

## CMI201209VR82KT
designator L?  Inductance: 820nH
Inductor, 820nH, ±10%, 700mΩ, 150mA, SMD 0805; Manufacturer: FH(Guangdong Fenghua Advanced Tech); Manufacturer Part Number: CMI201209VR82KT; Self-Resonant Frequency: 100MHz; Q Factor: 25@25MHz; Package Size: 0805; JLCPCB Basic Part: No; JLCPCB Part Number: C139231; Supplier 1: LCSC; Category: Inductors; Supplier Part Number 1: C139231; Tolerance: ±10%; Rated Current: 150mA; DC Resistance: 700mΩ; RoHS: Yes; ComponentLink1Description: Datasheet; ComponentLink1URL: https://wmsc.lcsc.com/wmsc/upload/file/pdf/v2/lcsc/2302231230_FH--Guangdong-Fenghua-Advanced-Tech-CMI201209VR82KT_C139231.pdf; ComponentLink2Description: JLCPCB Part URL; ComponentLink2URL: https://jlcpcb.com/partdetail/C139231; ComponentLink3Description: LCSC Part URL; ComponentLink3URL: https://lcsc.com/product-detail/Inductors-SMD_FH-Guangdong-Fenghua-Advanced-Tech-FH-Guangdong-Fenghua-Advanced-Tech-CMI201209VR82KT_C139231.html
footprint IND-0805 (0805 (2012M) Inductor)
pins: 1, 2
